# Altium footprint library Indruino.PcbLib: 383 footprints (part 22 of 24)
Each footprint in its own frame and in the unit in brackets; x right, y up, seen from the top. Pads: shape width x height; smd on the part's side, far side on the other; paste and mask are expansions set on the pad; w line width, h text height; cw(c..) or ccw(c..) is an arc to the next point about the centre after c.
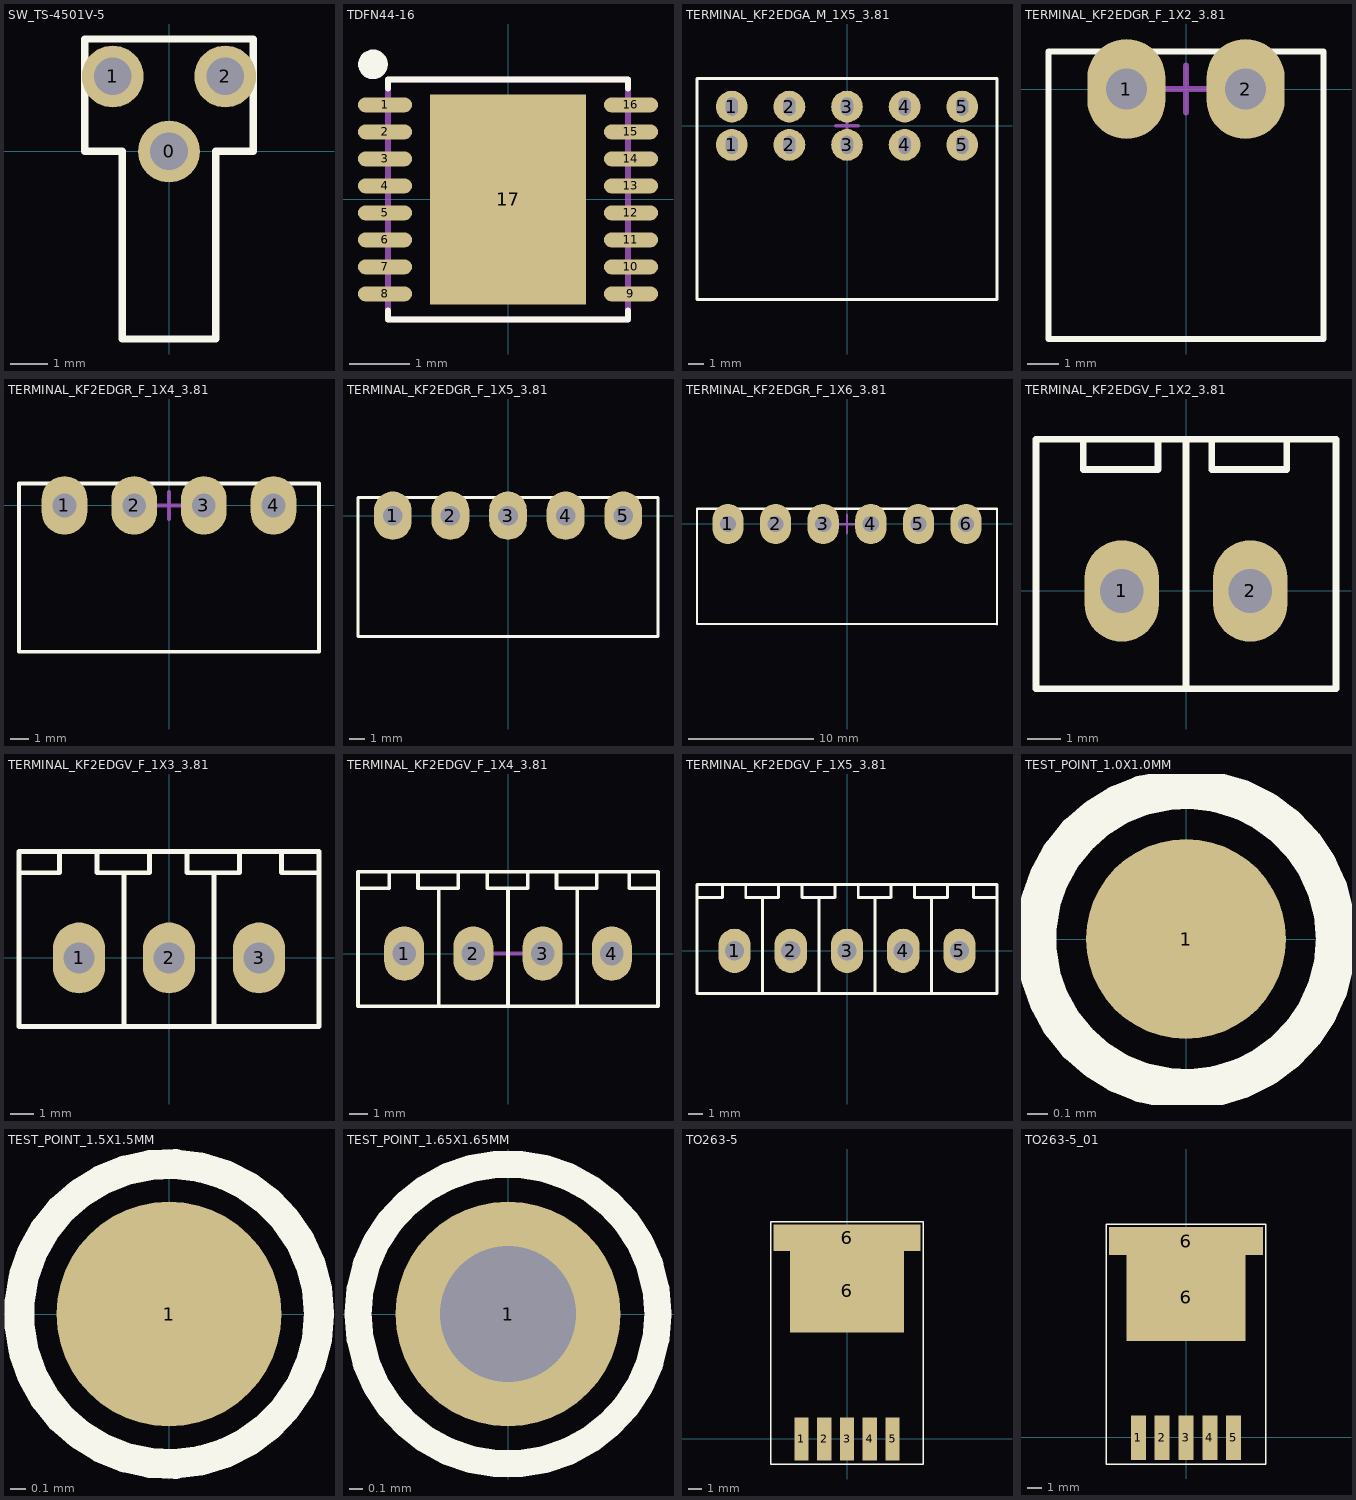
[diagram p21: the footprints below, top view; thin cyan lines are the x and y axes]

## SW_TS-4501V-5 [mm] "http://thegioiic.com/products/ts-4501v-5"
pads (3):
  round 1.65 hole 1: 0(0,0) 1(-1.5,2) 2(1.5,2)
Top Overlay:
  lines w0.2: -2.25,0 -2.25,3 2.25,3 2.25,0 1.25,0 1.25,-5 -1.25,-5 -1.25,0 -2.25,0
Mechanical 15:
  lines w0.1: -0.5,0 0.5,0 ; 0,-0.5 0,0.5
3D body: height 3.5, standoff 1, extent -1.25,-5 1.25,0
3D body: height 4.5, standoff 0, extent -2.25,0 2.25,3

## TDFN44-16 [mm]
pads (17):
  oval 0.9x0.25 smd: 1(-2.05,1.575) 2(-2.05,1.125) 3(-2.05,0.675) 4(-2.05,0.225) 5(-2.05,-0.225) 6(-2.05,-0.675) 7(-2.05,-1.125) 8(-2.05,-1.575) 9(2.05,-1.575) 10(2.05,-1.125) 11(2.05,-0.675) 12(2.05,-0.225) 13(2.05,0.225) 14(2.05,0.675) 15(2.05,1.125) 16(2.05,1.575)
  rect 2.6x3.5 smd: 17(0,0)
Top Overlay:
  circle w0.254: c-2.25,2.25 r0.12
  lines w0.1: -2,-1.85 -2,-2 2,-2 2,-1.85 ; -2,1.85 -2,2 2,2 2,1.85
Mechanical 13:
  lines w0.1: -2,-2 -2,2 2,2 2,-2 -2,-2
Mechanical 15:
  lines w0.1: -0.5,0 0.5,0 ; 0,-0.5 0,0.5
3D body: height 0.8, standoff 0, extent -2,-2 2,2

## TERMINAL_KF2EDGA_M_1X5_3.81 [mm]
pads (10):
  round 2.1 hole 1.2 slot 0.8 at 0 deg: 1(-7.62,-1.27) 1(-7.62,1.27) 2(-3.81,-1.27) 2(-3.81,1.27) 3(0,-1.27) 3(0,1.27) 4(3.81,-1.27) 4(3.81,1.27) 5(7.62,-1.27) 5(7.62,1.27)
Top Overlay:
  lines w0.2: -9.925,-11.5 -9.925,3.13 9.925,3.13 9.925,-11.5 -9.925,-11.5
Mechanical 15:
  lines w0.2: -0.75,0 0.75,0 ; 0,-0.75 0,0.75
3D body "hder.STEP": height 7, standoff 0, extent -10,-12.67 10,3.83

## TERMINAL_KF2EDGR_F_1X2_3.81 [mm]
pads (2):
  oval 2.5x3.2 hole 1.3: 1(-1.905,0) 2(1.905,0)
Top Overlay:
  lines w0.2: -4.4,-8 4.4,-8 4.4,1.2 -4.4,1.2 -4.4,-8
Mechanical 15:
  lines w0.2: -0.75,0 0.75,0 ; 0,-0.75 0,0.75
3D body "691322310002 (rev1).stp": height 7.2, standoff -3.5, extent -4.405,-8.002 4.405,1.198

## TERMINAL_KF2EDGR_F_1X4_3.81 [mm]
pads (4):
  oval 2.5x3.2 hole 1.3: 1(-5.715,0) 2(-1.905,0) 3(1.905,0) 4(5.715,0)
Top Overlay:
  lines w0.2: -8.2,-8 8.2,-8 8.2,1.2 -8.2,1.2 -8.2,-8
Mechanical 15:
  lines w0.2: -0.75,0 0.75,0 ; 0,-0.75 0,0.75
3D body "691322310004 (rev1).stp": height 7.2, standoff -3.5, extent -8.215,-8.002 8.215,1.198

## TERMINAL_KF2EDGR_F_1X5_3.81 [mm]
pads (5):
  oval 2.5x3.2 hole 1.3: 1(-7.62,0) 2(-3.81,0) 3(0,0) 4(3.81,0) 5(7.62,0)
Top Overlay:
  lines w0.2: -9.925,-8 -9.925,1.2 9.925,1.2 9.925,-8 -9.925,-8
Mechanical 15:
  lines w0.2: -0.75,0 0.75,0 ; 0,-0.75 0,0.75
3D body "User Library-1803303.step": height 7.25, standoff -3.4, extent -10.215,-8 10.225,1.3

## TERMINAL_KF2EDGR_F_1X6_3.81 [mm]
pads (6):
  oval 2.5x3.2 hole 1.3: 1(-9.525,0) 2(-5.715,0) 3(-1.905,0) 4(1.905,0) 5(5.715,0) 6(9.525,0)
Top Overlay:
  lines w0.2: -12,-8 12,-8 12,1.2 -12,1.2 -12,-8
Mechanical 15:
  lines w0.2: -0.75,0 0.75,0 ; 0,-0.75 0,0.75
3D body "691322310006 (rev1).stp": height 7.2, standoff -3.5, extent -12.025,-8 12.025,1.2

## TERMINAL_KF2EDGV_F_1X2_3.81 [mm] "WURTH: 691321300002"
pads (2):
  oval 2.2x3 hole 1.3: 1(-1.905,0) 2(1.905,0)
Top Overlay:
  lines w0.2: -3.048,4.5 -3.048,3.6 -1.938,3.6 ; -1.928,3.6 -0.828,3.6 -0.828,4.5 ; 0,-2.8 0,4.5 ; 0.762,4.5 0.762,3.6 1.872,3.6 ; 1.882,3.6 2.982,3.6 2.982,4.5 ; -4.445,-2.9 -4.445,4.5 4.445,4.5 4.445,-2.9 -4.445,-2.9
3D body "691321300002 (rev1).stp": height 9.25, standoff -3.45, extent -4.405,-2.78 4.405,4.42

## TERMINAL_KF2EDGV_F_1X3_3.81 [mm] "WURTH: 691321300003"
pads (3):
  oval 2.2x3 hole 1.3: 1(-3.81,0) 2(0,0) 3(3.81,0)
Top Overlay:
  lines w0.2: -6.35,3.6 -4.638,3.6 -4.638,4.5 ; -3.048,4.5 -3.048,3.6 -1.938,3.6 ; -1.928,3.6 -0.828,3.6 -0.828,4.5 ; -1.905,-2.8 -1.905,3.6 ; 0.762,4.5 0.762,3.6 1.872,3.6 ; 1.882,3.6 2.982,3.6 2.982,4.5 ; 1.905,-2.8 1.905,3.6 ; 5.875,3.6 4.765,3.6 ; 6.35,3.6 4.765,3.6 ; 4.765,3.6 4.765,4.5 4.765,3.6 ; -6.35,-2.9 6.35,-2.9 6.35,4.5 -6.35,4.5 -6.35,-2.9
Mechanical 15:
  lines w0.2: -0.75,0 0.75,0 ; 0,-0.75 0,0.75
3D body "691321300003 (rev1).stp": height 9.25, standoff -3.45, extent -6.31,-2.78 6.31,4.42

## TERMINAL_KF2EDGV_F_1X4_3.81 [mm] "WURTH: 691321300003"
pads (4):
  oval 2.2x3 hole 1.3: 1(-5.715,0) 2(-1.905,0) 3(1.905,0) 4(5.715,0)
Top Overlay:
  lines w0.2: -8.255,3.6 -6.543,3.6 -6.543,4.5 ; -4.953,4.5 -4.953,3.6 -3.843,3.6 ; -3.833,3.6 -2.733,3.6 -2.733,4.5 ; -3.81,-2.8 -3.81,3.6 ; -1.143,4.5 -1.143,3.6 -0.033,3.6 ; -0.023,3.6 1.077,3.6 1.077,4.5 ; 0,-2.8 0,3.6 ; 2.667,4.5 2.667,3.6 3.777,3.6 ; 3.787,3.6 4.887,3.6 4.887,4.5 ; 3.81,-2.8 3.81,3.6 ; 7.78,3.6 6.67,3.6 ; 8.255,3.6 6.67,3.6 ; 6.67,3.6 6.67,4.5 6.67,3.6 ; -8.255,-2.9 8.255,-2.9 8.255,4.5 -8.255,4.5 -8.255,-2.9
Mechanical 15:
  lines w0.2: -0.75,0 0.75,0 ; 0,-0.75 0,0.75
3D body "691321300004 (rev1).stp": height 9.25, standoff -3.45, extent -8.215,-2.78 8.215,4.42

## TERMINAL_KF2EDGV_F_1X5_3.81 [mm] "WURTH: 691321300005"
pads (5):
  oval 2.2x3 hole 1.3: 1(-7.62,0) 2(-3.81,0) 3(0,0) 4(3.81,0) 5(7.62,0)
Top Overlay:
  lines w0.2: -10.16,3.6 -8.448,3.6 -8.448,4.5 ; -6.858,4.5 -6.858,3.6 -5.748,3.6 ; -5.738,3.6 -4.638,3.6 -4.638,4.5 ; -5.715,-2.8 -5.715,3.6 ; -3.048,4.5 -3.048,3.6 -1.938,3.6 ; -1.928,3.6 -0.828,3.6 -0.828,4.5 ; -1.905,-2.8 -1.905,3.6 ; 0.762,4.5 0.762,3.6 1.872,3.6 ; 1.882,3.6 2.982,3.6 2.982,4.5 ; 1.905,-2.8 1.905,3.6 ; 5.682,3.6 4.572,3.6 ; 5.692,3.6 6.792,3.6 6.792,4.5 ; 5.715,-2.8 5.715,3.6 ; 6.082,3.6 4.572,3.6 ; 9.685,3.6 8.575,3.6 ; 10.16,3.6 8.575,3.6 ; 4.572,3.6 4.572,4.5 4.572,3.6 ; 8.575,3.6 8.575,4.5 8.575,3.6 ; -10.16,-2.9 10.16,-2.9 10.16,4.5 -10.16,4.5 -10.16,-2.9
Mechanical 15:
  lines w0.2: -0.75,0 0.75,0 ; 0,-0.75 0,0.75
3D body "691321300005 (rev1).stp": height 9.25, standoff -3.45, extent -10.12,-2.78 10.12,4.42

## TEST_POINT_1.0X1.0MM [mm]
pads (1):
  round 1 smd: 1(0,0)
Top Overlay:
  circle w0.2: c0,0 r0.75

## TEST_POINT_1.5X1.5MM [mm]
pads (1):
  round 1.5 smd: 1(0,0)
Top Overlay:
  circle w0.2: c0,0 r1

## TEST_POINT_1.65X1.65MM [mm]
pads (1):
  round 1.65 hole 1: 1(0,0)
Top Overlay:
  circle w0.2: c0,0 r1.1

## TO263-5 [mm] "LM2576-SMD"
pads (7):
  rect 1.07x3.2 smd: 1(-3.4,-0.025) 2(-1.7,-0.025) 3(0,-0.025) 4(1.7,-0.025) 5(3.4,-0.025)
  rect 8.5x6.25 smd: 6(0,11.025)
  rect 11x2 smd: 6(0,15)
Top Overlay:
  lines w0.1: -5.7,-1.9 5.7,-1.9 5.7,16.2 -5.7,16.2 -5.7,-1.9
3D body "SW3dPS-TO263-5.STEP": height 4.79, standoff -0.01, extent -5,-0.381 5,15.289

## TO263-5_01 [mm] "LM2576-SMD"
pads (7):
  rect 1.07x3.2 smd: 1(-3.4,-0.025) 2(-1.7,-0.025) 3(0,-0.025) 4(1.7,-0.025) 5(3.4,-0.025)
  rect 8.5x6.25 smd: 6(0,10)
  rect 11x2 smd: 6(0,14)
Top Overlay:
  lines w0.1: -5.7,-1.9 5.7,-1.9 5.7,15.2 -5.7,15.2 -5.7,-1.9
3D body "SW3dPS-TO263-5.STEP": height 4.79, standoff -0.01, extent -5,-1.381 5,14.289